# Altium footprint library Reflow3D1411sep.PcbLib: 657 footprints (part 34 of 42)
Each footprint in its own frame and in the unit in brackets; x right, y up, seen from the top. Pads: shape width x height; smd on the part's side, far side on the other; paste and mask are expansions set on the pad; w line width, h text height; cw(c..) or ccw(c..) is an arc to the next point about the centre after c.
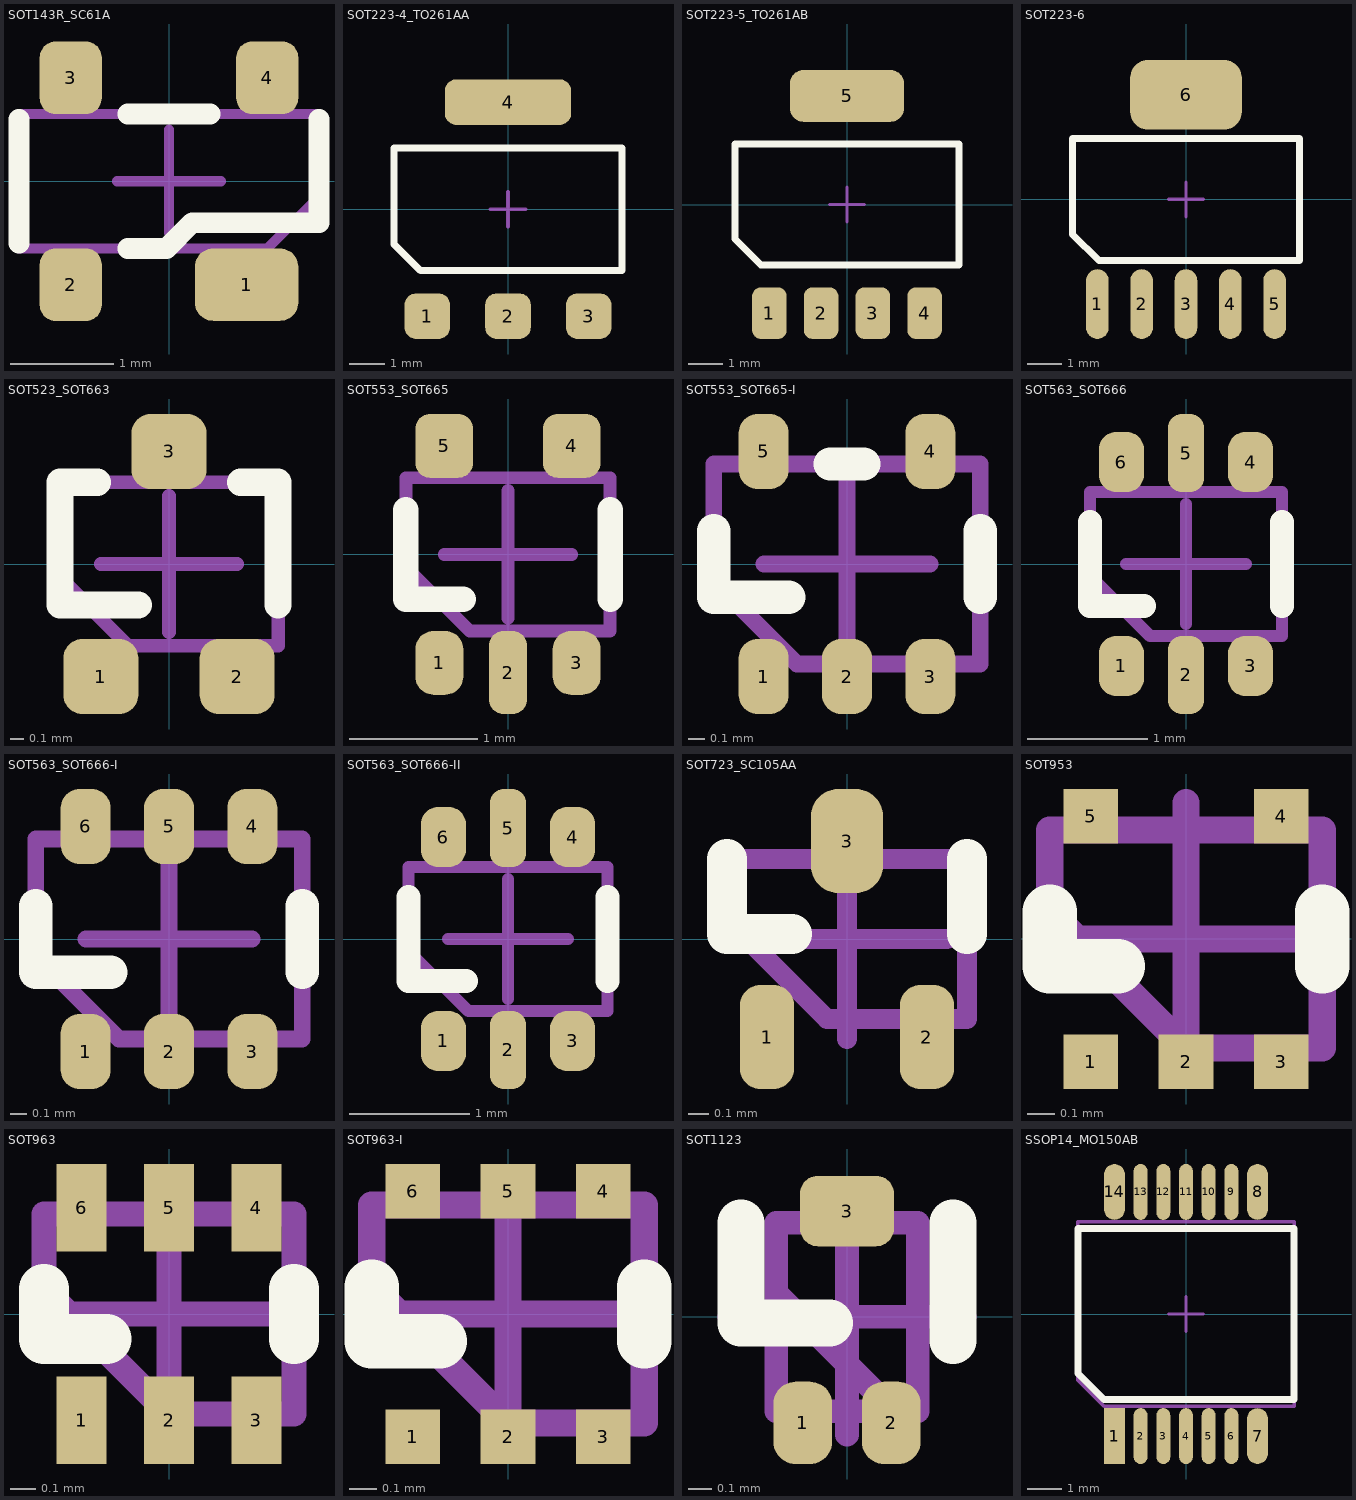
[diagram p33: the footprints below, top view; thin cyan lines are the x and y axes]

## SOT143R_SC61A [mm] "www.nxp.com, SOT143R.pdf, SOT143R_fr.pdf"
height 1
pads (4):
  rrect50% 1x0.7 smd mask+0.075: 1(0.75,-1)
  rrect50% 0.6x0.7 smd mask+0.075: 2(-0.95,-1) 3(-0.95,1) 4(0.95,1)
Top Overlay:
  lines w0.2: -1.45,-0.6 -1.45,0.6 ; -0.4,-0.65 -0.025,-0.65 0.225,-0.4 1.45,-0.4 1.45,0.6 ; -0.4,0.65 0.4,0.65
Mechanical 13:
  lines w0.1: -1.45,-0.65 -1.45,0.65 1.45,0.65 1.45,-0.15 0.95,-0.65 -1.45,-0.65
Mechanical 15:
  lines w0.1: -0.5,0 0.5,0 ; 0,-0.5 0,0.5
3D body: height 1.1, standoff 0, extent -1.5,-0.7 1.5,0.7

## SOT223-4_TO261AA [mm] "www.nxp.com, sot223_po.pdf, SOT223_fr.pdf; www.jedec.org, TO-261c.pdf"
height 1.65
pads (4):
  rrect50% 1.3x1.3 smd mask+0.075: 1(-2.3,-3.05) 2(0,-3.05) 3(2.3,-3.05)
  rrect50% 3.6x1.3 smd paste-25.4 mask+0.075: 4(0,3.05)
Top Overlay:
  lines w0.2: -3.25,-1 -3.25,1.75 3.25,1.75 3.25,-1.75 -2.5,-1.75 -3.25,-1
Top Paste:
  region: -1.75,3.65 -1.75,2.45 -0.15,2.45 -0.15,3.65
  region: 0.15,3.65 0.15,2.45 1.75,2.45 1.75,3.65
Mechanical 13:
  lines w0.1: -3.25,-1 -3.25,1.75 3.25,1.75 3.25,-1.75 -2.5,-1.75 -3.25,-1
Mechanical 15:
  lines w0.1: -0.5,0 0.5,0 ; 0,-0.5 0,0.5
3D body: height 1.8, standoff 0, extent -3.35,-1.85 3.35,1.85

## SOT223-5_TO261AB [mm] "www.national.com, mp05a.pdf; www.jedec.org, TO-261c.pdf"
height 1.65
pads (5):
  rrect50% 1x1.5 smd mask+0.075: 1(-2.25,-3.15) 2(-0.75,-3.15) 3(0.75,-3.15) 4(2.25,-3.15)
  rrect50% 3.3x1.5 smd mask+0.075: 5(0,3.15)
Top Overlay:
  lines w0.2: -3.25,-1 -3.25,1.75 3.25,1.75 3.25,-1.75 -2.5,-1.75 -3.25,-1
Mechanical 13:
  lines w0.1: -3.25,-1 -3.25,1.75 3.25,1.75 3.25,-1.75 -2.5,-1.75 -3.25,-1
Mechanical 15:
  lines w0.1: -0.5,0 0.5,0 ; 0,-0.5 0,0.5
3D body: height 1.8, standoff 0, extent -3.35,-1.85 3.35,1.85

## SOT223-6 [mm] "www.ti.com, mpds098c.pdf; www.microchip.com, en012702.pdf"
height 1.66
pads (6):
  oval 0.65x2 smd mask+0.075: 1(-2.54,-3) 2(-1.27,-3) 3(0,-3) 4(1.27,-3) 5(2.54,-3)
  rrect50% 3.2x2 smd mask+0.075: 6(0,3)
Top Overlay:
  lines w0.2: -3.25,-1 -2.5,-1.75 3.25,-1.75 3.25,1.75 -3.25,1.75 -3.25,-1
Mechanical 13:
  lines w0.1: -3.25,-1 -2.5,-1.75 3.25,-1.75 3.25,1.75 -3.25,1.75 -3.25,-1
Mechanical 15:
  lines w0.1: -0.5,0 0.5,0 ; 0,-0.5 0,0.5
3D body: height 1.8, standoff 0, extent -3.275,-1.775 3.275,1.775

## SOT523_SOT663 [mm] "www.nxp.com, SOT663.pdf, SOT663_FR.pdf"
height 0.55
pads (3):
  rrect50% 0.55x0.55 smd mask+0.075: 1(-0.5,-0.825) 2(0.5,-0.825) 3(0,0.825)
Top Overlay:
  lines w0.2: -0.525,0.6 -0.8,0.6 -0.8,-0.3 -0.225,-0.3 ; 0.525,0.6 0.8,0.6 0.8,-0.3
Mechanical 13:
  lines w0.1: -0.8,-0.1 -0.3,-0.6 0.8,-0.6 0.8,0.6 -0.8,0.6 -0.8,-0.1
Mechanical 15:
  lines w0.1: -0.5,0 0.5,0 ; 0,-0.5 0,0.5
3D body: height 0.6, standoff 0, extent -0.85,-0.65 0.85,0.65

## SOT553_SOT665 [mm] "www.nxp.com, SOT665.pdf, SOT665_fr.pdf"
height 0.55
pads (5):
  rrect75% 0.375x0.5 smd mask+0.05: 1(-0.538,-0.85) 3(0.538,-0.85)
  rrect75% 0.3x0.65 smd mask+0.05: 2(0,-0.925)
  rrect50% 0.45x0.5 smd mask+0.05: 4(0.5,0.85) 5(-0.5,0.85)
Top Overlay:
  lines w0.2: -0.8,0.35 -0.8,-0.35 -0.35,-0.35 ; 0.8,-0.35 0.8,0.35
Mechanical 13:
  lines w0.1: -0.8,-0.1 -0.8,0.6 0.8,0.6 0.8,-0.6 -0.3,-0.6 -0.8,-0.1
Mechanical 15:
  lines w0.1: -0.5,0 0.5,0 ; 0,-0.5 0,0.5
3D body: height 0.6, standoff 0, extent -0.85,-0.65 0.85,0.65

## SOT553_SOT665-I [mm] "www.onsemi.com, 463B-01.PDF"
height 0.55
pads (5):
  rrect75% 0.3x0.45 smd mask+0.05: 1(-0.5,-0.675) 2(0,-0.675) 3(0.5,-0.675) 4(0.5,0.675) 5(-0.5,0.675)
Top Overlay:
  lines w0.2: -0.8,0.2 -0.8,-0.2 -0.35,-0.2 ; -0.1,0.6 0.1,0.6 ; 0.8,-0.2 0.8,0.2
Mechanical 13:
  lines w0.1: -0.8,-0.1 -0.3,-0.6 0.8,-0.6 0.8,0.6 -0.8,0.6 -0.8,-0.1
Mechanical 15:
  lines w0.1: -0.5,0 0.5,0 ; 0,-0.5 0,0.5
3D body: height 0.6, standoff 0, extent -0.85,-0.65 0.85,0.65

## SOT563_SOT666 [mm] "www.nxp.com, sot666_po.pdf, SOT666_fr.pdf"
height 0.55
pads (6):
  rrect75% 0.375x0.5 smd mask+0.05: 1(-0.538,-0.85) 3(0.538,-0.85) 4(0.538,0.85) 6(-0.538,0.85)
  rrect75% 0.3x0.65 smd mask+0.05: 2(0,-0.925) 5(0,0.925)
Top Overlay:
  lines w0.2: -0.8,0.35 -0.8,-0.35 -0.35,-0.35 ; 0.8,-0.35 0.8,0.35
Mechanical 13:
  lines w0.1: -0.8,-0.1 -0.8,0.6 0.8,0.6 0.8,-0.6 -0.3,-0.6 -0.8,-0.1
Mechanical 15:
  lines w0.1: -0.5,0 0.5,0 ; 0,-0.5 0,0.5
3D body: height 0.6, standoff 0, extent -0.85,-0.65 0.85,0.65

## SOT563_SOT666-I [mm] "www.onsemi.com, 463A-01.PDF"
height 0.55
pads (6):
  rrect75% 0.3x0.45 smd mask+0.05: 1(-0.5,-0.675) 2(0,-0.675) 3(0.5,-0.675) 4(0.5,0.675) 5(0,0.675) 6(-0.5,0.675)
Top Overlay:
  lines w0.2: -0.8,0.2 -0.8,-0.2 -0.35,-0.2 ; 0.8,-0.2 0.8,0.2
Mechanical 13:
  lines w0.1: -0.8,-0.1 -0.3,-0.6 0.8,-0.6 0.8,0.6 -0.8,0.6 -0.8,-0.1
Mechanical 15:
  lines w0.1: -0.5,0 0.5,0 ; 0,-0.5 0,0.5
3D body: height 0.6, standoff 0, extent -0.85,-0.65 0.85,0.65

## SOT563_SOT666-II [mm] "www.nxp.com, SOT666_fr.pdf; www.vishay.com, 72067.pdf"
height 0.58
pads (6):
  rrect75% 0.375x0.5 smd mask+0.05: 1(-0.538,-0.85) 3(0.538,-0.85) 4(0.538,0.85) 6(-0.538,0.85)
  rrect75% 0.3x0.65 smd mask+0.05: 2(0,-0.925) 5(0,0.925)
Top Overlay:
  lines w0.2: -0.83,0.35 -0.83,-0.35 -0.35,-0.35 ; 0.83,-0.35 0.83,0.35
Mechanical 13:
  lines w0.1: -0.83,-0.1 -0.83,0.6 0.83,0.6 0.83,-0.6 -0.33,-0.6 -0.83,-0.1
Mechanical 15:
  lines w0.1: -0.5,0 0.5,0 ; 0,-0.5 0,0.5
3D body: height 0.6, standoff 0, extent -0.85,-0.65 0.85,0.65

## SOT723_SC105AA [mm] "www.onsemi.com, 631AA.PDF"
height 0.5
pads (3):
  rrect75% 0.27x0.52 smd mask+0.075: 1(-0.4,-0.49) 2(0.4,-0.49)
  rrect75% 0.36x0.52 smd mask+0.075: 3(0,0.49)
Top Overlay:
  lines w0.2: -0.6,0.4 -0.6,0.025 -0.275,0.025 ; 0.6,0.025 0.6,0.4
Mechanical 13:
  lines w0.1: -0.6,0.1 -0.1,-0.4 0.6,-0.4 0.6,0.4 -0.6,0.4 -0.6,0.1
Mechanical 15:
  lines w0.1: -0.5,0 0.5,0 ; 0,-0.5 0,0.5
3D body: height 0.55, standoff 0, extent -0.625,-0.425 0.625,0.425

## SOT953 [mm] "www.onsemi.com, 527AE.PDF"
height 0.37
pads (5):
  rect 0.2x0.2 smd mask+0.075: 1(-0.35,-0.45) 2(0,-0.45) 3(0.35,-0.45) 4(0.35,0.45) 5(-0.35,0.45)
Top Overlay:
  lines w0.2: -0.5,0.1 -0.5,-0.1 -0.25,-0.1 ; 0.5,-0.1 0.5,0.1
Mechanical 13:
  lines w0.1: -0.5,0.1 -0.5,0.4 0.5,0.4 0.5,-0.4 0,-0.4 -0.5,0.1
Mechanical 15:
  lines w0.1: -0.5,0 0.5,0 ; 0,-0.5 0,0.5
3D body: height 0.4, standoff 0, extent -0.525,-0.425 0.525,0.425

## SOT963 [mm] "www.onsemi.com, 527AD.PDF"
height 0.37
pads (6):
  rect 0.2x0.35 smd mask+0.075: 1(-0.35,-0.425) 2(0,-0.425) 3(0.35,-0.425) 4(0.35,0.425) 5(0,0.425) 6(-0.35,0.425)
Top Overlay:
  lines w0.2: -0.5,0.1 -0.5,-0.1 -0.25,-0.1 ; 0.5,-0.1 0.5,0.1
Mechanical 13:
  lines w0.1: -0.5,0.1 0,-0.4 0.5,-0.4 0.5,0.4 -0.5,0.4 -0.5,0.1
Mechanical 15:
  lines w0.1: -0.5,0 0.5,0 ; 0,-0.5 0,0.5
3D body: height 0.4, standoff 0, extent -0.525,-0.425 0.525,0.425

## SOT963-I [mm] "www.onsemi.com, 527AA.PDF"
height 0.45
pads (6):
  rect 0.2x0.2 smd mask+0.075: 1(-0.35,-0.45) 2(0,-0.45) 3(0.35,-0.45) 4(0.35,0.45) 5(0,0.45) 6(-0.35,0.45)
Top Overlay:
  lines w0.2: -0.5,0.1 -0.5,-0.1 -0.25,-0.1 ; 0.5,-0.1 0.5,0.1
Mechanical 13:
  lines w0.1: -0.5,0.1 -0.5,0.4 0.5,0.4 0.5,-0.4 0,-0.4 -0.5,0.1
Mechanical 15:
  lines w0.1: -0.5,0 0.5,0 ; 0,-0.5 0,0.5
3D body: height 0.5, standoff 0, extent -0.525,-0.425 0.525,0.425

## SOT1123 [mm] "www.onsemi.com, 524AA.PDF"
height 0.37
pads (3):
  rrect75% 0.25x0.35 smd mask+0.075: 1(-0.188,-0.45) 2(0.188,-0.45)
  rrect50% 0.4x0.3 smd mask+0.075: 3(0,0.45)
Top Overlay:
  lines w0.2: -0.45,0.4 -0.45,-0.025 -0.075,-0.025 ; 0.45,-0.1 0.45,0.4
Mechanical 13:
  lines w0.1: -0.3,0.1 0.2,-0.4 ; -0.3,-0.4 0.3,-0.4 0.3,0.4 -0.3,0.4 -0.3,-0.4
Mechanical 15:
  lines w0.1: -0.5,0 0.5,0 ; 0,-0.5 0,0.5
3D body: height 0.4, standoff 0, extent -0.325,-0.425 0.325,0.425

## SSOP14_MO150AB [mm] "www.nxp.com, sot337-1_po.pdf, SOT337-1_fp_reflow.pdf"
height 1.85
pads (14):
  rect 0.6x1.6 smd mask+0.05: 1(-2.05,-3.5)
  oval 0.4x1.6 smd mask+0.05: 2(-1.3,-3.5) 3(-0.65,-3.5) 4(0,-3.5) 5(0.65,-3.5) 6(1.3,-3.5) 9(1.3,3.5) 10(0.65,3.5) 11(0,3.5) 12(-0.65,3.5) 13(-1.3,3.5)
  oval 0.6x1.6 smd mask+0.05: 7(2.05,-3.5) 8(2.05,3.5) 14(-2.05,3.5)
Top Overlay:
  lines w0.2: -3.1,-1.7 -3.1,2.45 3.1,2.45 3.1,-2.45 -2.35,-2.45 -3.1,-1.7
Mechanical 13:
  lines w0.1: -3.1,-1.9 -3.1,2.65 3.1,2.65 3.1,-2.65 -2.35,-2.65 -3.1,-1.9
Mechanical 15:
  lines w0.1: -0.5,0 0.5,0 ; 0,-0.5 0,0.5
3D body: height 2, standoff 0, extent -3.2,-2.7 3.2,2.7